# Altium footprint library AltiumDesignerLibraries.PcbLib: 313 footprints (part 14 of 20)
Each footprint in its own frame and in the unit in brackets; x right, y up, seen from the top. Pads: shape width x height; smd on the part's side, far side on the other; paste and mask are expansions set on the pad; w line width, h text height; cw(c..) or ccw(c..) is an arc to the next point about the centre after c.
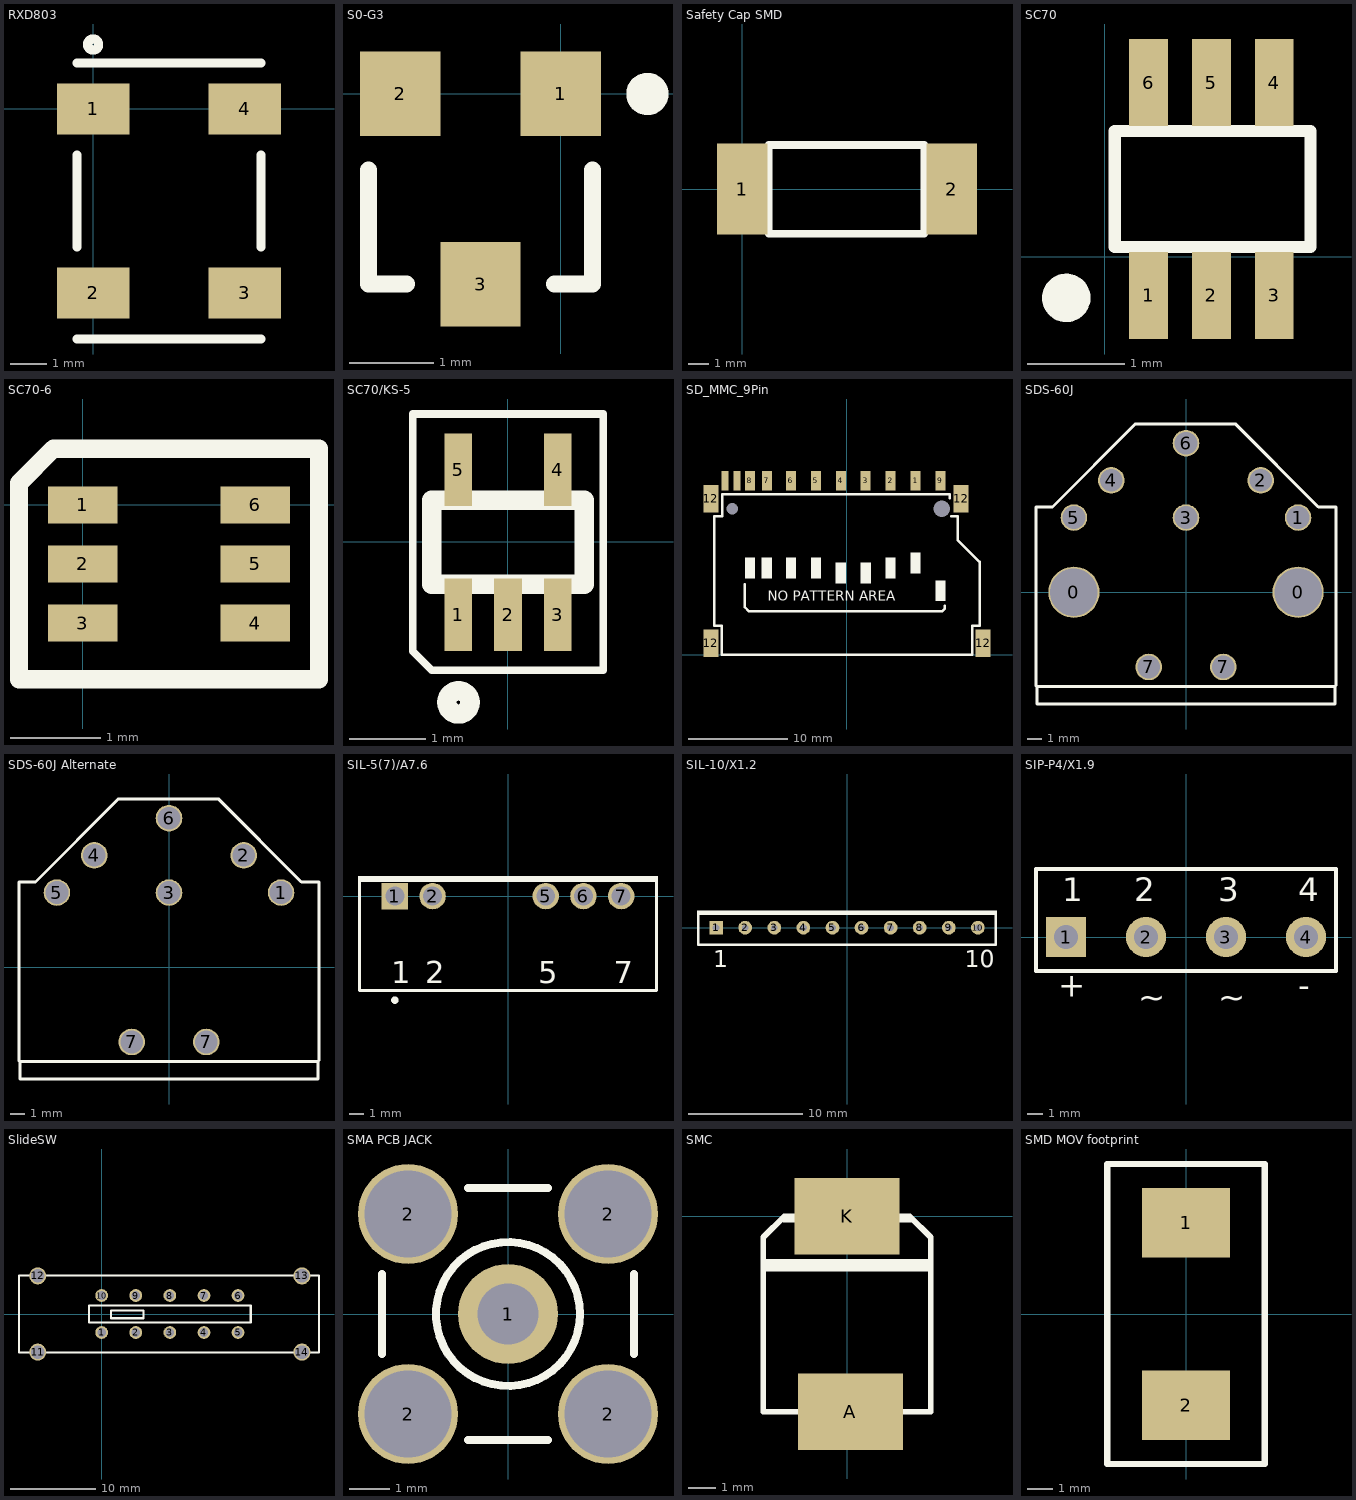
[diagram p13: the footprints below, top view; thin cyan lines are the x and y axes]

## RXD803 [mm]
pads (4):
  rect 2x1.4 smd: 1(0,0) 2(0,-5.08) 3(4.191,-5.08) 4(4.191,0)
Top Overlay:
  circle w0.254: c0,1.778 r0.152
  lines w0.254: -0.445,-6.35 4.635,-6.35 ; -0.445,-3.81 -0.445,-1.27 ; -0.445,1.27 4.635,1.27 ; 4.635,-3.81 4.635,-1.27

## S0-G3 [mm] "SOT-23"
pads (3):
  rect 0.95x1 smd: 1(0,0) 2(-1.9,0) 3(-0.95,-2.25)
Top Overlay:
  circle w0.25: c1.025,0 r0.125
  lines w0.2: -2.275,-0.9 -2.275,-2.25 -1.825,-2.25 ; -0.075,-2.25 0.378,-2.25 ; 0.375,-2.25 0.375,-0.9

## Safety Cap SMD [mm] "Class Y1 Safety capacitor footprint"
height 2.5
pads (2):
  rect 2.54x4.54 smd: 1(0,0) 2(10.5,0)
Top Overlay:
  lines w0.381: 1.336,-2.242 9.111,-2.242 9.128,-2.225 9.128,2.204 9.127,2.205 1.336,2.205 1.336,-2.242

## SC70 [mm] "SC70-6"
height 1.1
pads (6):
  rect 0.4x0.9 smd mask+0.05: 1(0.45,-0.4) 2(1.1,-0.4) 3(1.75,-0.4) 4(1.75,1.8) 5(1.1,1.8) 6(0.45,1.8)
Top Overlay:
  circle w0.25: c-0.4,-0.425 r0.125
  lines w0.127: 0.1,0.1 0.1,1.3 2.125,1.3 2.125,0.1 0.1,0.1

## SC70-6 [mil]
height 43.31
pads (6):
  rect 30x16 smd mask+3: 1(0,0) 2(0,-25.59) 3(0,-51.18) 4(74.8,-51.18) 5(74.8,-25.59) 6(74.8,0)
Top Overlay:
  lines w8: -27.6,-75.59 102.4,-75.59 102.4,24.41 -12.6,24.41 -27.6,9.41 -27.6,-75.59

## SC70/KS-5 [mm]
pads (5):
  rect 0.361x0.95 smd: 1(-0.647,-0.954) 2(0.003,-0.954) 3(0.653,-0.954) 4(0.653,0.946) 5(-0.647,0.946)
Top Overlay:
  lines w0.1: -1.247,-1.434 -1.247,1.675 1.253,1.675 1.253,-1.683 -0.998,-1.683 -1.247,-1.434
  lines w0.254: -0.998,-0.555 1.004,-0.555 1.004,0.548 -0.998,0.548 -0.998,-0.555 ; -0.798,-2.103 ccw(c-0.646,-2.103) -0.494,-2.103 ccw(c-0.646,-2.103) -0.798,-2.103

## SD_MMC_9Pin [mm] "CCM05-5777LFT T50 -- CON SMART CARD SD/MMC 9PIN"
height 2.692
pads (17):
  rect 1x2 smd: 1(6.875,17.45) 2(4.375,17.45) 3(1.875,17.45) 4(-0.625,17.45) 5(-3.125,17.45) 6(-5.625,17.45) 7(-8.05,17.45) 8(-9.75,17.45) 9(9.375,17.45)
  rect 0.7x2 smd: 10(-12.25,17.45) 11(-11.05,17.45)
  rect 1.5x2.8 smd: 12(-13.65,1.15) 12(-13.65,15.65) 12(11.45,15.65) 12(13.65,1.15)
  round 0 hole 1.15 unplated: ""(-11.5,14.65)
  round 0 hole 1.65 unplated: ""(9.488,14.65)
Top Overlay:
  rectangle: -8.558,7.663 -7.542,9.733
  rectangle: -6.133,7.663 -5.117,9.733
  rectangle: -3.633,7.663 -2.617,9.733
  rectangle: -1.133,7.163 -0.117,9.233
  rectangle: 1.367,7.163 2.383,9.233
  rectangle: 3.867,7.663 4.883,9.733
  rectangle: 6.367,8.163 7.383,10.233
  rectangle: 8.867,5.363 9.883,7.433
  rectangle: -10.258,7.663 -9.242,9.733
  lines w0.254: -10.252,7.048 -10.252,4.762 -9.871,4.381 9.56,4.381 9.814,4.635 9.814,4.889 ; 10.322,15.684 10.322,16.116 -12.538,16.116 -12.538,13.906 -13.3,13.906 -13.3,2.882 -12.563,2.882 -12.563,0 12.557,0 12.557,2.882 13.3,2.882 13.3,9.3 11.1,11.5 11.1,11.57 11.1,13.89 10.465,13.89
  text "NO PATTERN AREA" at -7.966,5.397 h1

## SDS-60J [mil] "Right Angle PCB mount DIN6"
pads (10):
  round 135 hole 125: 0(-295.5,0) 0(295.5,0)
  round 70 hole 60: 1(295.5,197) 2(197,295) 3(0,197) 4(-197,295) 5(-295.5,197) 6(0,393) 7(-98.5,-197) 7(98.5,-197)
Top Overlay:
  lines w7.87: 393,-294.5 393.5,-295 -393.5,-295 -393.5,-248.5 -394,-248 ; 393,-248 -394,-248 ; 393.5,-294.5 393.5,-248 395.5,-246 395.5,225 349,225 130,444 -133,444 -352,225 -395,225 -395.5,-246.5 -394,-248

## SDS-60J Alternate [mil] "Right Angle DIN PCM mount without screw mount holes"
pads (8):
  round 70 hole 60: 1(295.5,197) 2(197,295) 3(0,197) 4(-197,295) 5(-295.5,197) 6(0,393) 7(-98.5,-197) 7(98.5,-197)
Top Overlay:
  lines w7.87: 393,-294.5 393.5,-295 -393.5,-295 -393.5,-248.5 -394,-248 ; 393,-248 -394,-248 ; 393.5,-294.5 393.5,-248 395.5,-246 395.5,225 349,225 130,444 -133,444 -352,225 -395,225 -395.5,-246.5 -394,-248

## SIL-5(7)/A7.6 [mil]
pads (5):
  rect 70x70 hole 50: 1(-300,0)
  round 70 hole 50: 2(-200,0) 5(100,0) 6(200,0) 7(300,0)
Top Overlay:
  circle w9.84: c-300,-275.59 r4.92
  rectangle: -397.64,37.4 397.64,53.15
  lines w7.87: -393.7,49.21 -393.7,-250 393.7,-250 393.7,49.21
  text "1" at -309.84,-231.3 h59.06
  text "7" at 280.31,-231.3 h59.06
  text "5" at 80.31,-231.3 h59.06
  text "2" at -219.69,-231.3 h59.06

## SIL-10/X1.2 [mm]
pads (10):
  rect 1.2x1.2 hole 0.6: 1(-11.43,0)
  round 1.2 hole 0.6: 2(-8.89,0) 3(-6.35,0) 4(-3.81,0) 5(-1.27,0) 6(1.27,0) 7(3.81,0) 8(6.35,0) 9(8.89,0) 10(11.43,0)
Top Overlay:
  rectangle: -13.1,1.1 13.1,1.5
  lines w0.2: -13,1.4 -13,-1.5 13,-1.5 13,1.4
  text "10" at 10.305,-3.475 h1.5
  text "1" at -11.68,-3.475 h1.5

## SIP-P4/X1.9 [mil]
height 625
pads (4):
  rect 100x100 hole 60: 1(-300,0)
  round 100 hole 60: 2(-100,0) 3(100,0) 4(300,0)
Top Overlay:
  lines w10: -375,-85 -375,170 375,170 375,-85 -375,-85
  text "1" at -310,90 h59.06
  text "2" at -130,90 h59.06
  text "3" at 80,90 h59.06
  text "4" at 280,90 h59.06
  text "-" at 280,-150 h59.06
  text "+" at -320,-150 h59.06
  text "~" at -120,-180 h59.06
  text "~" at 80,-180 h59.06

## SlideSW [mm]
pads (14):
  round 1.5 hole 1: 1(0,-2.17) 2(4,-2.17) 3(8,-2.17) 4(12,-2.17) 5(16,-2.17) 6(16,2.17) 7(12,2.17) 8(8,2.17) 9(4,2.17) 10(0,2.17)
  round 2 hole 1.6: 11(-7.5,-4.475) 12(-7.5,4.475) 13(23.5,4.475) 14(23.5,-4.475)
Top Overlay:
  lines w0.254: -9.7,-4.5 25.5,-4.5 25.5,4.5 -9.7,4.5 -9.7,-4.5 ; -1.5,-1 17.5,-1 17.5,1 -1.5,1 -1.5,-1 ; 1.1,-0.5 1.1,0.4 4.9,0.4 4.9,-0.5 1.1,-0.5
3D body: height 10, standoff 0, extent -10.1,-4.5 25.9,4.5
3D body: height 24, standoff 0, extent -2.5,-0.5 17.5,0.5

## SMA PCB JACK [mm] "SMA Straight PCB Jack"
pads (5):
  round 2.5 hole 1.524: 1(0,0)
  round 2.5 hole 2.184: 2(-2.5,-2.5) 2(-2.5,2.5) 2(2.5,-2.5) 2(2.5,2.5)
Top Overlay:
  circle w0.2: c0,0 r1.8
  lines w0.2: -3.15,-1 -3.15,1 ; -1,-3.15 1,-3.15 ; -1,3.15 1,3.15 ; 3.15,-1 3.15,1
Mechanical 1:
  circle w0.025: c0,0 r1.8
  circle w0.025: c0,0 r1.05
  circle w0.025: c0,0 r0.2

## SMC [mil]
height 83.86
pads (2):
  rect 150x110 smd mask+3: A(5,-280) K(0,0)
Top Overlay:
  lines w8: -120,-75 120,-75 120,-70 -120,-70 -120,-65 120,-65 ; -90,-5 95,-5 ; -85,-280 -120,-280 ; -80,0 -90,0 ; 80,0 90,0 ; 85,-280 120,-280 ; -120,-280 120,-280 ; -120,-280 -120,-30 ; -120,-280 -120,-30 ; -120,-30 -90,0 ; -120,-30 -90,0 ; -90,0 90,0 ; 90,0 120,-30 ; 90,0 120,-30 ; 120,-280 120,-30 ; 120,-280 120,-30
Bottom Overlay:
  lines w8: -61,-40 57,-40 57,4 -61,4 -61,-40 ; -57,-284 61,-284 61,-240 -57,-240 -57,-284

## SMD MOV footprint [mm] "CU3225K275G2"
pads (2):
  rect 3.5x2.8 smd: 1(0,3.65) 2(0,-3.65)
Top Overlay:
  lines w0.254: -3.15,-6 -3.15,6 3.15,6 3.15,-6 -3.15,-6